# Altium schematic symbol library microbuilder.SCHLIB: 530 symbols (part 4 of 7)
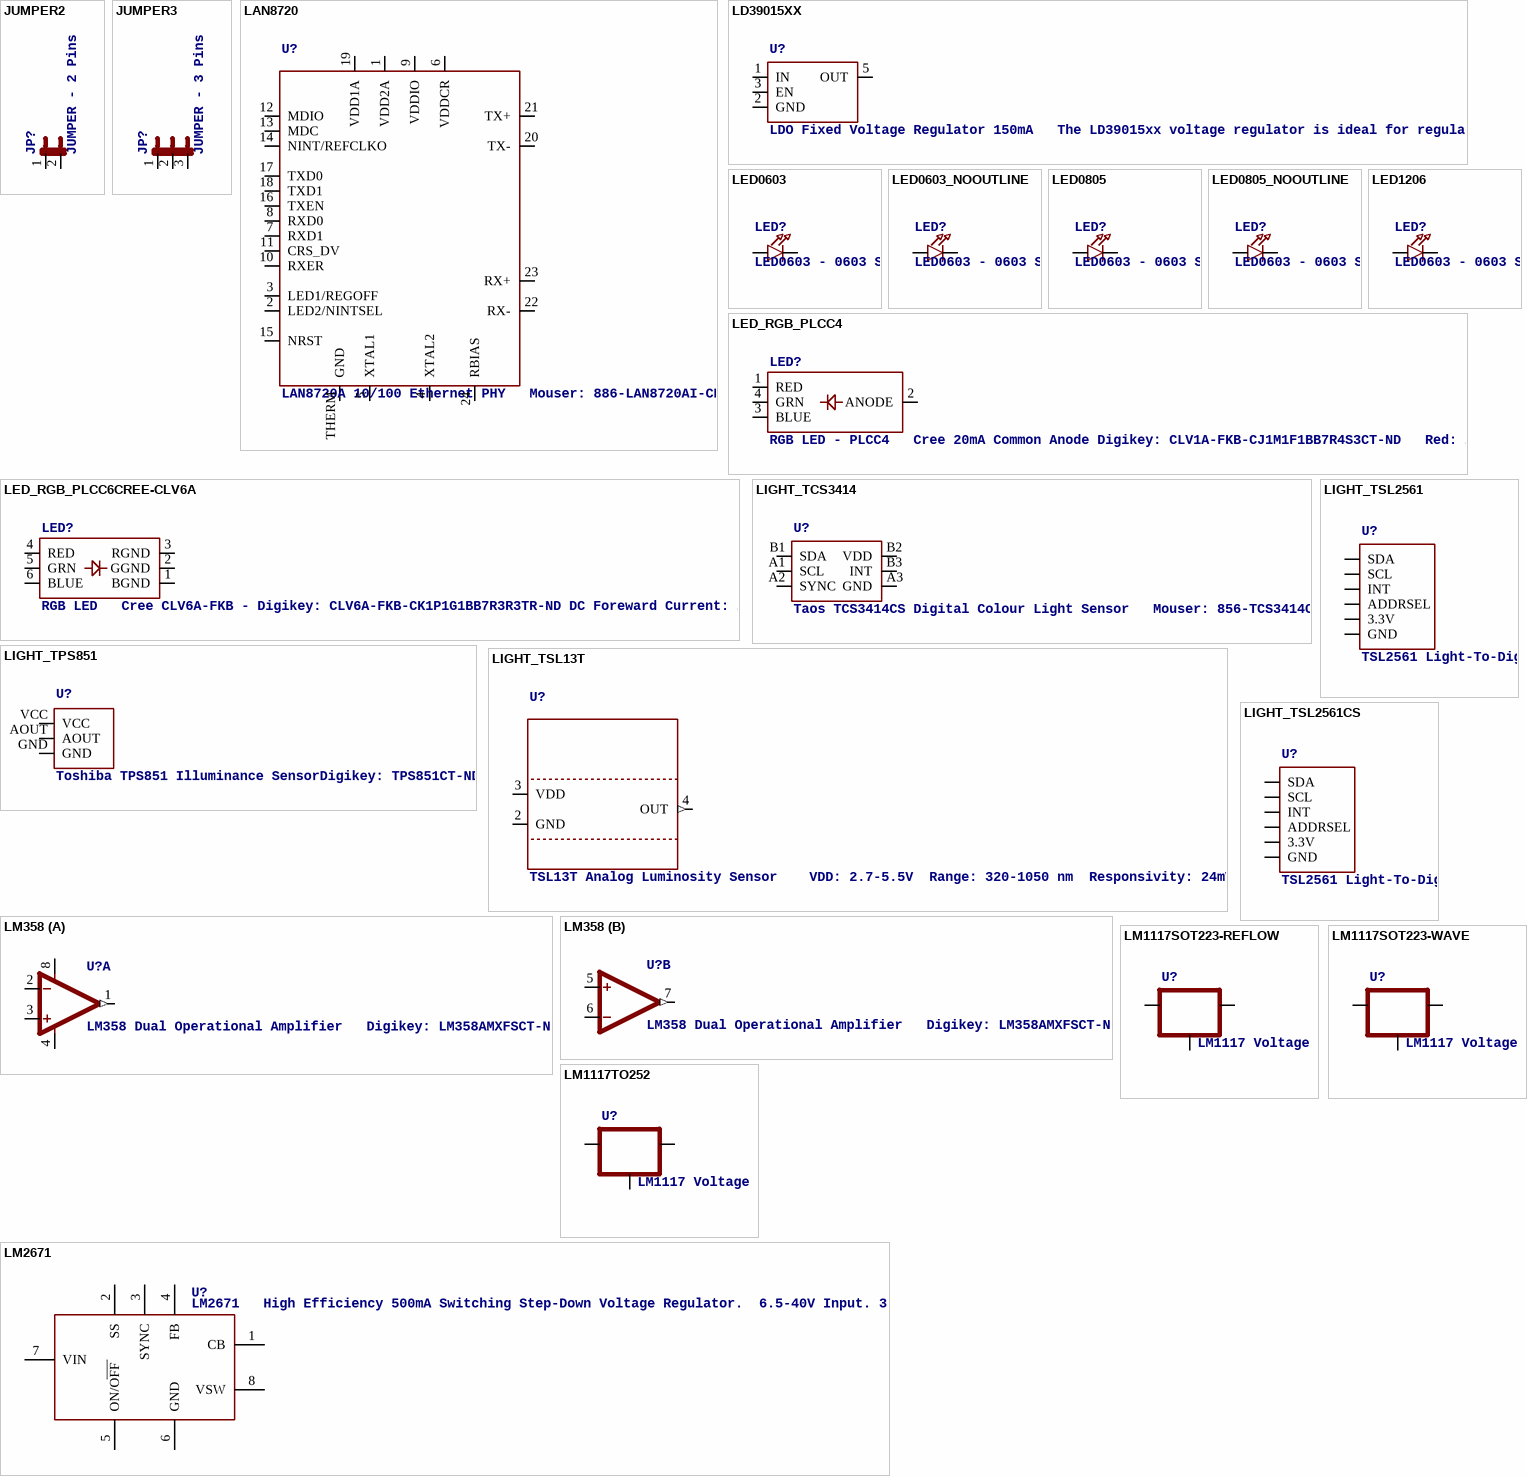
[diagram p55: symbols JUMPER2 to LM2671]

## LED0603_NOOUTLINE
designator LED?, comment LED0603 - 0603 Surface Mount Package    2mA: Green LED - Low Power (3.9mcd, 2ma, 1.7Vf) - Digikey: 475-2709-2-ND  Orange LED - Low Power (9.8mcd, 2ma, 1.8Vf) - Digikey: 475-1194-2-ND  Red LED - Low Power (5mcd, 2ma, 1.8Vf) - Digikey: 475-1195-2-ND  Yellow LED - Low Power (7mcd, 2ma, 1.8Vf) - Digikey: 475-1196-2-ND       5mA: Blue LED - Low Power (17mcd, 5ma, 2.9Vf) - Digikey: LNJ937W8CRACT-ND    0805 - 0805 Surface Mount Package    2mA: Red LED (8.8mcd, 2mA, 1.8Vf, Clear) - Low Power [Digikey: 475-2510-1-ND]  Green LED (5mcd, 2mA, 1.8Vf, Clear) - Low Power [Digikey: 475-2730-1-ND]  Yellow LED (11.3mcd, 2mA, 1.8Vf, Clear) - Low Power [Digikey: 475-2555-1-ND]       20mA: Red LED (104mcd, 20mA, Diffused) - LS R976 [Digikey: 475-1278-6-ND]  Red LED (12mcd, 20mA, 2.0Vf, Clear) - APT2012EC [Digikey: 754-1128-1-ND]  Green LED (15mcd, 20mA, 2.2Vf, Clear) - APT2012GC [Digikey: 754-1131-1-ND]  Orange LED (160mcd, 20mA, 2.1Vf, Clear) - APT2012SECK [Digikey: 754-1130-1-ND]     1206 - 1206 Surface Mount Package  Green LED (26mcd, 20mA, Diffused) - LG N971  [Digikey: 475-1407-6-ND]  Red LED (15mcd, 20mA, Diffused) - LH N974 [Digikey: 475-1416-6-ND]
footprint CHIPLED_0603_NOOUTLINE
pins: A, C

## LED0805
designator LED?, comment LED0603 - 0603 Surface Mount Package    2mA: Green LED - Low Power (3.9mcd, 2ma, 1.7Vf) - Digikey: 475-2709-2-ND  Orange LED - Low Power (9.8mcd, 2ma, 1.8Vf) - Digikey: 475-1194-2-ND  Red LED - Low Power (5mcd, 2ma, 1.8Vf) - Digikey: 475-1195-2-ND  Yellow LED - Low Power (7mcd, 2ma, 1.8Vf) - Digikey: 475-1196-2-ND       5mA: Blue LED - Low Power (17mcd, 5ma, 2.9Vf) - Digikey: LNJ937W8CRACT-ND    0805 - 0805 Surface Mount Package    2mA: Red LED (8.8mcd, 2mA, 1.8Vf, Clear) - Low Power [Digikey: 475-2510-1-ND]  Green LED (5mcd, 2mA, 1.8Vf, Clear) - Low Power [Digikey: 475-2730-1-ND]  Yellow LED (11.3mcd, 2mA, 1.8Vf, Clear) - Low Power [Digikey: 475-2555-1-ND]       20mA: Red LED (104mcd, 20mA, Diffused) - LS R976 [Digikey: 475-1278-6-ND]  Red LED (12mcd, 20mA, 2.0Vf, Clear) - APT2012EC [Digikey: 754-1128-1-ND]  Green LED (15mcd, 20mA, 2.2Vf, Clear) - APT2012GC [Digikey: 754-1131-1-ND]  Orange LED (160mcd, 20mA, 2.1Vf, Clear) - APT2012SECK [Digikey: 754-1130-1-ND]     1206 - 1206 Surface Mount Package  Green LED (26mcd, 20mA, Diffused) - LG N971  [Digikey: 475-1407-6-ND]  Red LED (15mcd, 20mA, Diffused) - LH N974 [Digikey: 475-1416-6-ND]
footprint CHIPLED_0805
pins: A, C

## LED0805_NOOUTLINE
designator LED?, comment LED0603 - 0603 Surface Mount Package    2mA: Green LED - Low Power (3.9mcd, 2ma, 1.7Vf) - Digikey: 475-2709-2-ND  Orange LED - Low Power (9.8mcd, 2ma, 1.8Vf) - Digikey: 475-1194-2-ND  Red LED - Low Power (5mcd, 2ma, 1.8Vf) - Digikey: 475-1195-2-ND  Yellow LED - Low Power (7mcd, 2ma, 1.8Vf) - Digikey: 475-1196-2-ND       5mA: Blue LED - Low Power (17mcd, 5ma, 2.9Vf) - Digikey: LNJ937W8CRACT-ND    0805 - 0805 Surface Mount Package    2mA: Red LED (8.8mcd, 2mA, 1.8Vf, Clear) - Low Power [Digikey: 475-2510-1-ND]  Green LED (5mcd, 2mA, 1.8Vf, Clear) - Low Power [Digikey: 475-2730-1-ND]  Yellow LED (11.3mcd, 2mA, 1.8Vf, Clear) - Low Power [Digikey: 475-2555-1-ND]       20mA: Red LED (104mcd, 20mA, Diffused) - LS R976 [Digikey: 475-1278-6-ND]  Red LED (12mcd, 20mA, 2.0Vf, Clear) - APT2012EC [Digikey: 754-1128-1-ND]  Green LED (15mcd, 20mA, 2.2Vf, Clear) - APT2012GC [Digikey: 754-1131-1-ND]  Orange LED (160mcd, 20mA, 2.1Vf, Clear) - APT2012SECK [Digikey: 754-1130-1-ND]     1206 - 1206 Surface Mount Package  Green LED (26mcd, 20mA, Diffused) - LG N971  [Digikey: 475-1407-6-ND]  Red LED (15mcd, 20mA, Diffused) - LH N974 [Digikey: 475-1416-6-ND]
footprint CHIPLED_0805_NOOUTLINE
pins: A, C

## LED1206
designator LED?, comment LED0603 - 0603 Surface Mount Package    2mA: Green LED - Low Power (3.9mcd, 2ma, 1.7Vf) - Digikey: 475-2709-2-ND  Orange LED - Low Power (9.8mcd, 2ma, 1.8Vf) - Digikey: 475-1194-2-ND  Red LED - Low Power (5mcd, 2ma, 1.8Vf) - Digikey: 475-1195-2-ND  Yellow LED - Low Power (7mcd, 2ma, 1.8Vf) - Digikey: 475-1196-2-ND       5mA: Blue LED - Low Power (17mcd, 5ma, 2.9Vf) - Digikey: LNJ937W8CRACT-ND    0805 - 0805 Surface Mount Package    2mA: Red LED (8.8mcd, 2mA, 1.8Vf, Clear) - Low Power [Digikey: 475-2510-1-ND]  Green LED (5mcd, 2mA, 1.8Vf, Clear) - Low Power [Digikey: 475-2730-1-ND]  Yellow LED (11.3mcd, 2mA, 1.8Vf, Clear) - Low Power [Digikey: 475-2555-1-ND]       20mA: Red LED (104mcd, 20mA, Diffused) - LS R976 [Digikey: 475-1278-6-ND]  Red LED (12mcd, 20mA, 2.0Vf, Clear) - APT2012EC [Digikey: 754-1128-1-ND]  Green LED (15mcd, 20mA, 2.2Vf, Clear) - APT2012GC [Digikey: 754-1131-1-ND]  Orange LED (160mcd, 20mA, 2.1Vf, Clear) - APT2012SECK [Digikey: 754-1130-1-ND]     1206 - 1206 Surface Mount Package  Green LED (26mcd, 20mA, Diffused) - LG N971  [Digikey: 475-1407-6-ND]  Red LED (15mcd, 20mA, Diffused) - LH N974 [Digikey: 475-1416-6-ND]
footprint CHIPLED_1206
pins: A, C

## LED_RGB_PLCC4
designator LED?, comment RGB LED - PLCC4   Cree 20mA Common Anode Digikey: CLV1A-FKB-CJ1M1F1BB7R4S3CT-ND   Red: 2.6V Vf, 550mcd Green: 3.2V Vf, 850mcd Blue: 3.2V Vf, 320mcd
footprint RGBLED_PLCC4
pins: 1 RED, 2 ANODE (power), 3 BLUE, 4 GRN

## LED_RGB_PLCC6CREE-CLV6A
designator LED?, comment RGB LED   Cree CLV6A-FKB - Digikey: CLV6A-FKB-CK1P1G1BB7R3R3TR-ND DC Foreward Current: 20mA  Foreward Voltage: R = 2.0, G = 3.2, B = 3.2  Viewing Angle: 120°
footprint RGBLED_PLCC6
pins: 1 BGND (power), 2 GGND (power), 3 RGND (power), 4 RED, 5 GRN, 6 BLUE

## LIGHT_TCS3414
designator U?, comment Taos TCS3414CS Digital Colour Light Sensor   Mouser: 856-TCS3414CS
footprint TCS3414_CS6
pins: A1 SCL, A2 SYNC, A3 GND, B1 SDA, B2 VDD, B3 INT

## LIGHT_TPS851
designator U?, comment Toshiba TPS851 Illuminance SensorDigikey: TPS851CT-ND
footprint TPS851
pins: AOUT, GND, VCC

## LIGHT_TSL13T
designator U?, comment TSL13T Analog Luminosity Sensor    VDD: 2.7-5.5V  Range: 320-1050 nm  Responsivity: 24mV/(µW/cm²)    Mouser: 856-TSL13T
footprint TSL13T
pins: 2 GND (power), 3 VDD (power), 4 OUT (out)

## LIGHT_TSL2561
designator U?, comment TSL2561 Light-To-Digital Sensor   Mouser Part Numbers:  CS (obsolete): 856-TSL2561CS  DFN (cheapest): 856-TSL2561FN
footprint TSL2561_FN
pins: ADR ADDRSEL, CLK SCL, DATA SDA, INT, VDD 3.3V, VSS GND

## LIGHT_TSL2561CS
designator U?, comment TSL2561 Light-To-Digital Sensor   Mouser Part Numbers:  CS (obsolete): 856-TSL2561CS  DFN (cheapest): 856-TSL2561FN
footprint TSL2561_CS6
pins: ADDR ADDRSEL, GND, INT, SCL, SDA, VDD 3.3V

## LM358
designator U?, comment LM358 Dual Operational Amplifier   Digikey: LM358AMXFSCT-ND
footprint SOIC8_150MIL
part A pins: 1 OUT (out), 2 -IN, 3 +IN, 4 V- (power), 8 V+ (power)
part B pins: 5 +IN, 6 -IN, 7 OUT (out)

## LM1117SOT223-REFLOW
designator U?, comment LM1117 Voltage Regulator    LM1117 Adjustable Voltage regulator [Digikey: LM1117IMP-ADJDKR-ND] LM1117 3.3V Voltage regulator [AP1117E33GDIDKR-ND] LM1117 5.0V Voltage regulator [AP1117E50GDIDKR-ND]    SOT223-REFLOW - SOT223 package for solder paste/reflow ovens SOT223-WAVE - SOT223 package for hand-soldering (larger pads)   Note: For the fixed-voltage regulators, simply set the ADJ pin to GND.
footprint SOT223-R
pins: 1 ADJ, 2 OUT, 3 IN

## LM1117SOT223-WAVE
designator U?, comment LM1117 Voltage Regulator    LM1117 Adjustable Voltage regulator [Digikey: LM1117IMP-ADJDKR-ND] LM1117 3.3V Voltage regulator [AP1117E33GDIDKR-ND] LM1117 5.0V Voltage regulator [AP1117E50GDIDKR-ND]    SOT223-REFLOW - SOT223 package for solder paste/reflow ovens SOT223-WAVE - SOT223 package for hand-soldering (larger pads)   Note: For the fixed-voltage regulators, simply set the ADJ pin to GND.
footprint SOT223-W
pins: 1 ADJ, 2 OUT, 3 IN

## LM1117TO252
designator U?, comment LM1117 Voltage Regulator    LM1117 Adjustable Voltage regulator [Digikey: LM1117IMP-ADJDKR-ND] LM1117 3.3V Voltage regulator [AP1117E33GDIDKR-ND] LM1117 5.0V Voltage regulator [AP1117E50GDIDKR-ND]    SOT223-REFLOW - SOT223 package for solder paste/reflow ovens SOT223-WAVE - SOT223 package for hand-soldering (larger pads)   Note: For the fixed-voltage regulators, simply set the ADJ pin to GND.
footprint TO252
pins: 1 ADJ, 2 IN, 3 OUT

## LM2671
designator U?, comment LM2671   High Efficiency 500mA Switching Step-Down Voltage Regulator.  6.5-40V Input. 3.3V SOIC-8: Digikey LM2671M-3.3-ND
footprint SOIC8_150MIL
pins: 1 CB, 2 SS, 3 SYNC, 4 FB, 5 ON/OFF, 6 GND, 7 VIN, 8 VSW

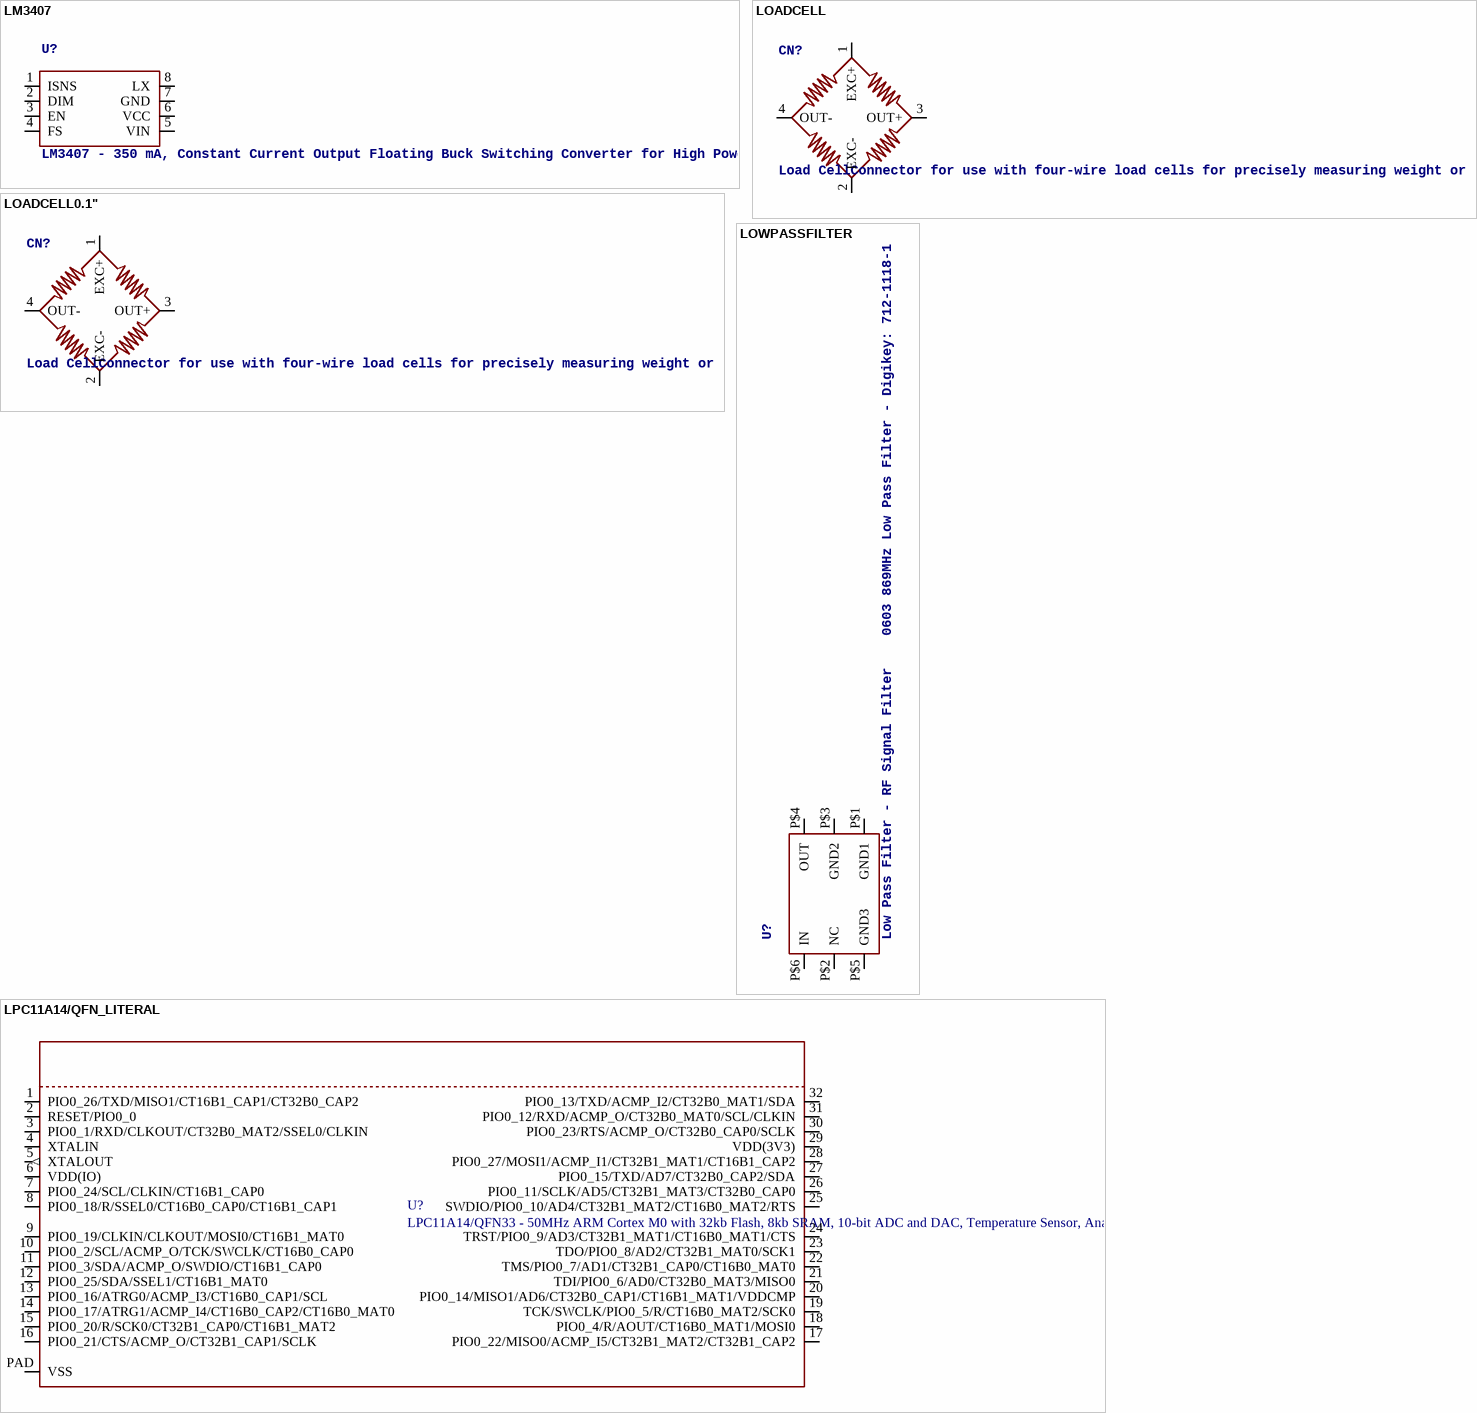
[diagram p27: symbols LM3407 to LPC11A14/QFN_LITERAL]

## LM3407
designator U?, comment LM3407 - 350 mA, Constant Current Output Floating Buck Switching Converter for High Power LEDs
footprint MSOP8_0.65MM
pins: 1 ISNS, 2 DIM, 3 EN, 4 FS, 5 VIN, 6 VCC, 7 GND, 8 LX

## LOADCELL
designator CN?, comment Load CellConnector for use with four-wire load cells for precisely measuring weight or pressure
footprint JSTPH4
pins: 1 EXC+, 2 EXC-, 3 OUT+, 4 OUT-

## LOADCELL0.1"
designator CN?, comment Load CellConnector for use with four-wire load cells for precisely measuring weight or pressure
footprint 1X04_OVAL
pins: 1 EXC+, 2 EXC-, 3 OUT+, 4 OUT-

## LOWPASSFILTER
designator U?, comment Low Pass Filter - RF Signal Filter    0603 869MHz Low Pass Filter - Digikey: 712-1118-1-ND
footprint LOWPASSFILTER0603
pins: P$1 GND1, P$2 NC, P$3 GND2, P$4 OUT, P$5 GND3, P$6 IN

## LPC11A14/QFN_LITERAL
designator U?, comment LPC11A14/QFN33 - 50MHz ARM Cortex M0 with 32kb Flash, 8kb SRAM, 10-bit ADC and DAC, Temperature Sensor, Analog Comparator, and 4kb EEPROM    Temp Range: -40°C - 85°C VDD: 2.6-3.6V
footprint HVQFN32
pins: 1 PIO0_26/TXD/MISO1/CT16B1_CAP1/CT32B0_CAP2, 2 RESET/PIO0_0, 3 PIO0_1/RXD/CLKOUT/CT32B0_MAT2/SSEL0/CLKIN, 4 XTALIN, 5 XTALOUT (out), 6 VDD(IO) (oe), 7 PIO0_24/SCL/CLKIN/CT16B1_CAP0, 8 PIO0_18/R/SSEL0/CT16B0_CAP0/CT16B1_CAP1, 9 PIO0_19/CLKIN/CLKOUT/MOSI0/CT16B1_MAT0, 10 PIO0_2/SCL/ACMP_O/TCK/SWCLK/CT16B0_CAP0, 11 PIO0_3/SDA/ACMP_O/SWDIO/CT16B1_CAP0, 12 PIO0_25/SDA/SSEL1/CT16B1_MAT0, 13 PIO0_16/ATRG0/ACMP_I3/CT16B0_CAP1/SCL, 14 PIO0_17/ATRG1/ACMP_I4/CT16B0_CAP2/CT16B0_MAT0, 15 PIO0_20/R/SCK0/CT32B1_CAP0/CT16B1_MAT2, 16 PIO0_21/CTS/ACMP_O/CT32B1_CAP1/SCLK, 17 PIO0_22/MISO0/ACMP_I5/CT32B1_MAT2/CT32B1_CAP2, 18 PIO0_4/R/AOUT/CT16B0_MAT1/MOSI0, 19 TCK/SWCLK/PIO0_5/R/CT16B0_MAT2/SCK0, 20 PIO0_14/MISO1/AD6/CT32B0_CAP1/CT16B1_MAT1/VDDCMP, 21 TDI/PIO0_6/AD0/CT32B0_MAT3/MISO0, 22 TMS/PIO0_7/AD1/CT32B1_CAP0/CT16B0_MAT0, 23 TDO/PIO0_8/AD2/CT32B1_MAT0/SCK1, 24 TRST/PIO0_9/AD3/CT32B1_MAT1/CT16B0_MAT1/CTS, 25 SWDIO/PIO0_10/AD4/CT32B1_MAT2/CT16B0_MAT2/RTS, 26 PIO0_11/SCLK/AD5/CT32B1_MAT3/CT32B0_CAP0, 27 PIO0_15/TXD/AD7/CT32B0_CAP2/SDA, 28 PIO0_27/MOSI1/ACMP_I1/CT32B1_MAT1/CT16B1_CAP2, 29 VDD(3V3) (oe), 30 PIO0_23/RTS/ACMP_O/CT32B0_CAP0/SCLK, 31 PIO0_12/RXD/ACMP_O/CT32B0_MAT0/SCL/CLKIN, 32 PIO0_13/TXD/ACMP_I2/CT32B0_MAT1/SDA, PAD VSS (oe)

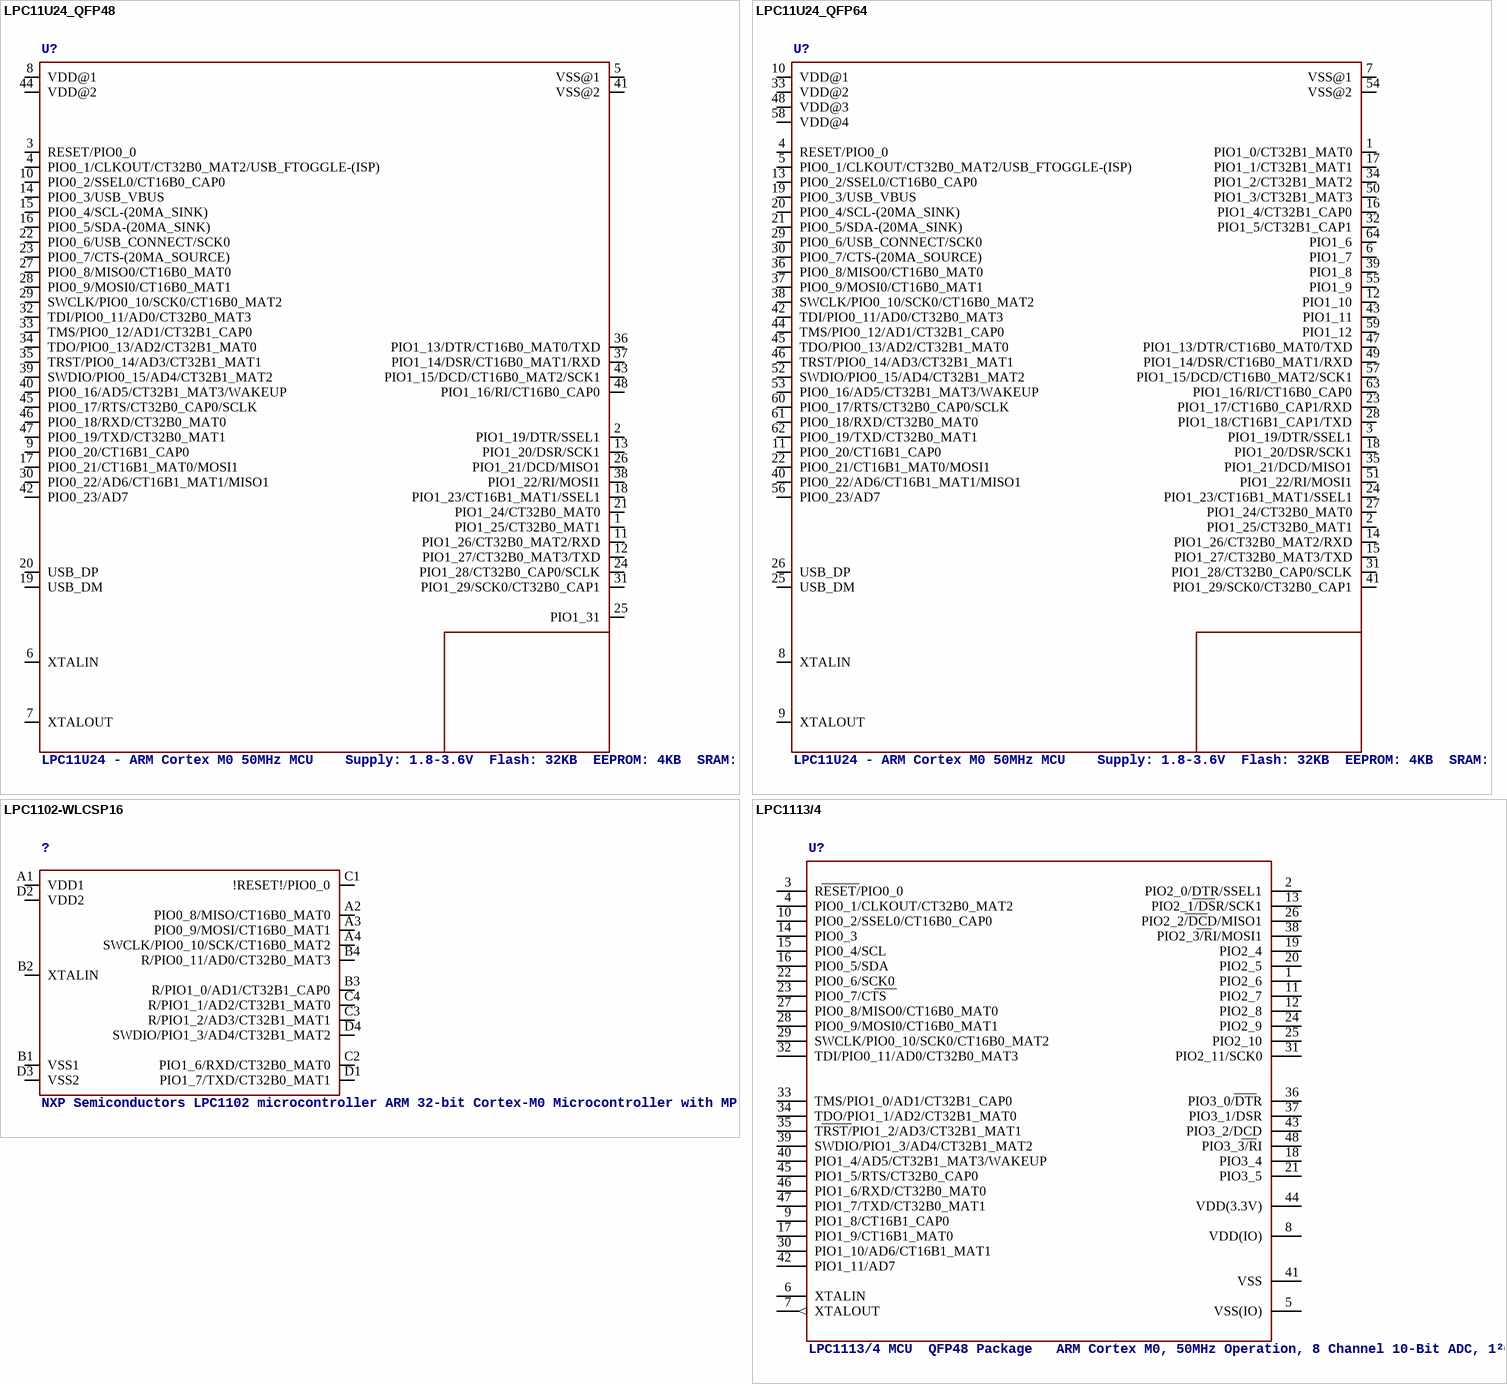
[diagram p28: symbols LPC11U24_QFP48 to LPC1113/4]

## LPC11U24_QFP48
designator U?, comment LPC11U24 - ARM Cortex M0 50MHz MCU    Supply: 1.8-3.6V  Flash: 32KB  EEPROM: 4KB  SRAM: 8KB + 2KB USB  Temp: -40°C - 85°C
footprint LQFP48
pins: 1 PIO1_25/CT32B0_MAT1, 2 PIO1_19/DTR/SSEL1, 3 RESET/PIO0_0, 4 PIO0_1/CLKOUT/CT32B0_MAT2/USB_FTOGGLE-(ISP), 5 VSS@1, 6 XTALIN, 7 XTALOUT, 8 VDD@1, 9 PIO0_20/CT16B1_CAP0, 10 PIO0_2/SSEL0/CT16B0_CAP0, 11 PIO1_26/CT32B0_MAT2/RXD, 12 PIO1_27/CT32B0_MAT3/TXD, 13 PIO1_20/DSR/SCK1, 14 PIO0_3/USB_VBUS, 15 PIO0_4/SCL-(20MA_SINK), 16 PIO0_5/SDA-(20MA_SINK), 17 PIO0_21/CT16B1_MAT0/MOSI1, 18 PIO1_23/CT16B1_MAT1/SSEL1, 19 USB_DM, 20 USB_DP, 21 PIO1_24/CT32B0_MAT0, 22 PIO0_6/USB_CONNECT/SCK0, 23 PIO0_7/CTS-(20MA_SOURCE), 24 PIO1_28/CT32B0_CAP0/SCLK, 25 PIO1_31, 26 PIO1_21/DCD/MISO1, 27 PIO0_8/MISO0/CT16B0_MAT0, 28 PIO0_9/MOSI0/CT16B0_MAT1, 29 SWCLK/PIO0_10/SCK0/CT16B0_MAT2, 30 PIO0_22/AD6/CT16B1_MAT1/MISO1, 31 PIO1_29/SCK0/CT32B0_CAP1, 32 TDI/PIO0_11/AD0/CT32B0_MAT3, 33 TMS/PIO0_12/AD1/CT32B1_CAP0, 34 TDO/PIO0_13/AD2/CT32B1_MAT0, 35 TRST/PIO0_14/AD3/CT32B1_MAT1, 36 PIO1_13/DTR/CT16B0_MAT0/TXD, 37 PIO1_14/DSR/CT16B0_MAT1/RXD, 38 PIO1_22/RI/MOSI1, 39 SWDIO/PIO0_15/AD4/CT32B1_MAT2, 40 PIO0_16/AD5/CT32B1_MAT3/WAKEUP, 41 VSS@2, 42 PIO0_23/AD7, 43 PIO1_15/DCD/CT16B0_MAT2/SCK1, 44 VDD@2, 45 PIO0_17/RTS/CT32B0_CAP0/SCLK, 46 PIO0_18/RXD/CT32B0_MAT0, 47 PIO0_19/TXD/CT32B0_MAT1, 48 PIO1_16/RI/CT16B0_CAP0

## LPC11U24_QFP64
designator U?, comment LPC11U24 - ARM Cortex M0 50MHz MCU    Supply: 1.8-3.6V  Flash: 32KB  EEPROM: 4KB  SRAM: 8KB + 2KB USB  Temp: -40°C - 85°C
footprint LQFP64
pins: 1 PIO1_0/CT32B1_MAT0, 2 PIO1_25/CT32B0_MAT1, 3 PIO1_19/DTR/SSEL1, 4 RESET/PIO0_0, 5 PIO0_1/CLKOUT/CT32B0_MAT2/USB_FTOGGLE-(ISP), 6 PIO1_7, 7 VSS@1, 8 XTALIN, 9 XTALOUT, 10 VDD@1, 11 PIO0_20/CT16B1_CAP0, 12 PIO1_10, 13 PIO0_2/SSEL0/CT16B0_CAP0, 14 PIO1_26/CT32B0_MAT2/RXD, 15 PIO1_27/CT32B0_MAT3/TXD, 16 PIO1_4/CT32B1_CAP0, 17 PIO1_1/CT32B1_MAT1, 18 PIO1_20/DSR/SCK1, 19 PIO0_3/USB_VBUS, 20 PIO0_4/SCL-(20MA_SINK), 21 PIO0_5/SDA-(20MA_SINK), 22 PIO0_21/CT16B1_MAT0/MOSI1, 23 PIO1_17/CT16B0_CAP1/RXD, 24 PIO1_23/CT16B1_MAT1/SSEL1, 25 USB_DM, 26 USB_DP, 27 PIO1_24/CT32B0_MAT0, 28 PIO1_18/CT16B1_CAP1/TXD, 29 PIO0_6/USB_CONNECT/SCK0, 30 PIO0_7/CTS-(20MA_SOURCE), 31 PIO1_28/CT32B0_CAP0/SCLK, 32 PIO1_5/CT32B1_CAP1, 33 VDD@2, 34 PIO1_2/CT32B1_MAT2, 35 PIO1_21/DCD/MISO1, 36 PIO0_8/MISO0/CT16B0_MAT0, 37 PIO0_9/MOSI0/CT16B0_MAT1, 38 SWCLK/PIO0_10/SCK0/CT16B0_MAT2, 39 PIO1_8, 40 PIO0_22/AD6/CT16B1_MAT1/MISO1, 41 PIO1_29/SCK0/CT32B0_CAP1, 42 TDI/PIO0_11/AD0/CT32B0_MAT3, 43 PIO1_11, 44 TMS/PIO0_12/AD1/CT32B1_CAP0, 45 TDO/PIO0_13/AD2/CT32B1_MAT0, 46 TRST/PIO0_14/AD3/CT32B1_MAT1, 47 PIO1_13/DTR/CT16B0_MAT0/TXD, 48 VDD@3, 49 PIO1_14/DSR/CT16B0_MAT1/RXD, 50 PIO1_3/CT32B1_MAT3, 51 PIO1_22/RI/MOSI1, 52 SWDIO/PIO0_15/AD4/CT32B1_MAT2, 53 PIO0_16/AD5/CT32B1_MAT3/WAKEUP, 54 VSS@2, 55 PIO1_9, 56 PIO0_23/AD7, 57 PIO1_15/DCD/CT16B0_MAT2/SCK1, 58 VDD@4, 59 PIO1_12, 60 PIO0_17/RTS/CT32B0_CAP0/SCLK, 61 PIO0_18/RXD/CT32B0_MAT0, 62 PIO0_19/TXD/CT32B0_MAT1, 63 PIO1_16/RI/CT16B0_CAP0, 64 PIO1_6

## LPC1102-WLCSP16
designator ?, comment NXP Semiconductors LPC1102 microcontroller ARM 32-bit Cortex-M0 Microcontroller with MPU  CPU clock up to 50MHz  32KByte on-chip Flash ROM with In-System Programming (ISP) and In-Application Programming (IAP) via On-Chip Bootloader  8KByte SRAM  Nested Vectored Interrupt Controller  SPI controller  UART with full Modem Interface and RS485 Support  4 Timers with 4 capture channels and 13 output channels  Watchdog (WDT)  Sytem tick timer  10-bit ADC with 5 channels  Power Management Unit (PMU)  Brownout detection  12MHz internal RC oscillator  Serial Wire Debug/Trace port
footprint WLCSP16
pins: A1 VDD1 (power), A2 PIO0_8/MISO/CT16B0_MAT0, A3 PIO0_9/MOSI/CT16B0_MAT1, A4 SWCLK/PIO0_10/SCK/CT16B0_MAT2, B1 VSS1 (power), B2 XTALIN, B3 R/PIO1_0/AD1/CT32B1_CAP0, B4 R/PIO0_11/AD0/CT32B0_MAT3, C1 !RESET!/PIO0_0, C2 PIO1_6/RXD/CT32B0_MAT0, C3 R/PIO1_2/AD3/CT32B1_MAT1, C4 R/PIO1_1/AD2/CT32B1_MAT0, D1 PIO1_7/TXD/CT32B0_MAT1, D2 VDD2 (power), D3 VSS2 (power), D4 SWDIO/PIO1_3/AD4/CT32B1_MAT2

## LPC1113/4
designator U?, comment LPC1113/4 MCU  QFP48 Package   ARM Cortex M0, 50MHz Operation, 8 Channel 10-Bit ADC, 1²C, 2xSPI, UART, 2x16 Bit and 2x32 Bit Timers, Internal 12MHz Oscillator, 1.8-3.6V operation.      Model	Flash	SRAM	Part N°:	Digikey	Mouser	   LPC1113	24KB	8KB	LPC1113FBD48/301	TBD	TBD	   LPC1114	32KB	8KB	LPC1114FBD48/301	568-4950-ND	771-LPC1114FBD483011
MANF: NXP; MANF#: LPC1114FBD48/301,1; DIGIKEY#: 568-4950-ND
footprint LQFP48
pins: 1 PIO2_6, 2 PIO2_0/DTR/SSEL1, 3 RESET/PIO0_0, 4 PIO0_1/CLKOUT/CT32B0_MAT2, 5 VSS(IO) (power), 6 XTALIN, 7 XTALOUT (out), 8 VDD(IO) (power), 9 PIO1_8/CT16B1_CAP0, 10 PIO0_2/SSEL0/CT16B0_CAP0, 11 PIO2_7, 12 PIO2_8, 13 PIO2_1/DSR/SCK1, 14 PIO0_3, 15 PIO0_4/SCL, 16 PIO0_5/SDA, 17 PIO1_9/CT16B1_MAT0, 18 PIO3_4, 19 PIO2_4, 20 PIO2_5, 21 PIO3_5, 22 PIO0_6/SCK0, 23 PIO0_7/CTS, 24 PIO2_9, 25 PIO2_10, 26 PIO2_2/DCD/MISO1, 27 PIO0_8/MISO0/CT16B0_MAT0, 28 PIO0_9/MOSI0/CT16B0_MAT1, 29 SWCLK/PIO0_10/SCK0/CT16B0_MAT2, 30 PIO1_10/AD6/CT16B1_MAT1, 31 PIO2_11/SCK0, 32 TDI/PIO0_11/AD0/CT32B0_MAT3, 33 TMS/PIO1_0/AD1/CT32B1_CAP0, 34 TDO/PIO1_1/AD2/CT32B1_MAT0, 35 TRST/PIO1_2/AD3/CT32B1_MAT1, 36 PIO3_0/DTR, 37 PIO3_1/DSR, 38 PIO2_3/RI/MOSI1, 39 SWDIO/PIO1_3/AD4/CT32B1_MAT2, 40 PIO1_4/AD5/CT32B1_MAT3/WAKEUP, 41 VSS (power), 42 PIO1_11/AD7, 43 PIO3_2/DCD, 44 VDD(3.3V) (power), 45 PIO1_5/RTS/CT32B0_CAP0, 46 PIO1_6/RXD/CT32B0_MAT0, 47 PIO1_7/TXD/CT32B0_MAT1, 48 PIO3_3/RI
